# Altium footprint library NDLib.PCBLIB: 499 footprints (part 10 of 32)
Each footprint in its own frame and in the unit in brackets; x right, y up, seen from the top. Pads: shape width x height; smd on the part's side, far side on the other; paste and mask are expansions set on the pad; w line width, h text height; cw(c..) or ccw(c..) is an arc to the next point about the centre after c.
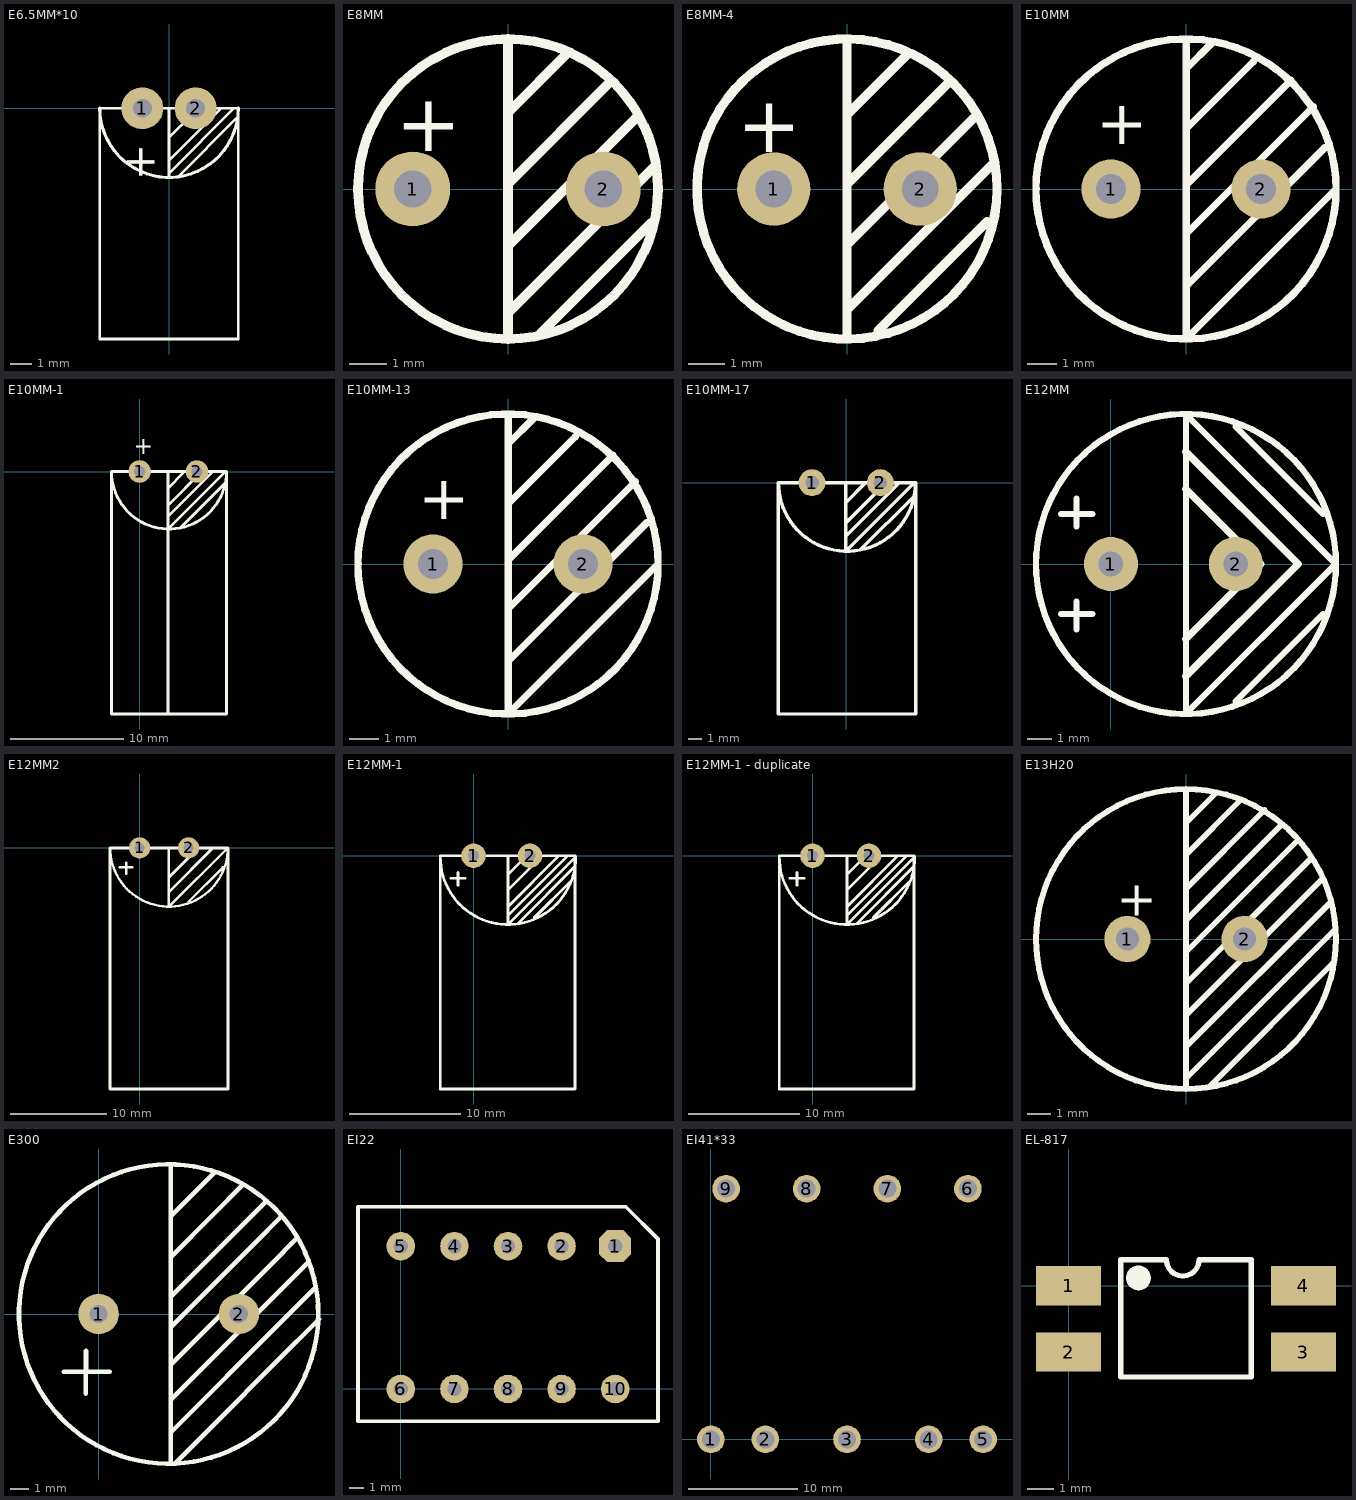
[diagram p9: the footprints below, top view; thin cyan lines are the x and y axes]

## E6.5MM*10 [mm]
pads (2):
  round 2 hole 0.9: 1(-1.27,0) 2(1.27,0)
TopOverlay:
  lines w0.127: 0,-3.3 0,0 -0.025,0 ; 0,-3.1 3.1,0 ; 0,-2.5 2.5,0 ; 0,-1.4 0.6,-0.8 ; 0.45,-3.25 3.2,-0.5 ; -0.025,0 3.3,0 3.3,-11 -3.3,-11 -3.3,0 -0.025,0
  lines w0.152: -3.3,0 ccw(c0,0) 3.3,0
  text "+" at -2,-1.7 h1.52

## E8MM [mm]
height 10
pads (2):
  round 2 hole 1: 1(-2.54,0) 2(2.54,0)
TopOverlay:
  circle w0.254: c0,0 r4
  lines w0.254: 0,-4 0,3.948 ; 0,-3.302 3.944,0.642 ; 0,-1.524 3.469,1.945 ; 0,-0.762 0,-0.508 ; 0,0.127 2.748,2.875 ; 0,0.254 0,0.508 ; 0,0.762 0,1.143 ; 0,2.032 1.617,3.649 ; 0,2.286 0,2.54 ; 0.854,-3.865 3.825,-0.894
  text "+" at -3,1 h1.52
3D body: height 7, standoff 0, extent -4.013,-4.039 2.838,3.987
3D body: height 7, standoff 0, extent 2.828,-2.863 4.013,2.812

## E8MM-4 [mm]
height 11
pads (2):
  round 2 hole 1: 1(-2,0) 2(2,0)
TopOverlay:
  circle w0.254: c0,0 r4.1
  lines w0.254: 0,-4 0,3.948 ; 0,-3.302 3.944,0.642 ; 0,-1.524 3.469,1.945 ; 0,-0.762 0,-0.508 ; 0,0.127 2.748,2.875 ; 0,0.254 0,0.508 ; 0,0.762 0,1.143 ; 0,2.032 1.617,3.649 ; 0,2.286 0,2.54 ; 0.854,-3.865 3.825,-0.894
  text "+" at -3,1 h1.52

## E10MM [mm]
pads (2):
  round 2 hole 1: 1(-2.54,0) 2(2.54,0)
TopOverlay:
  circle w0.254: c0,0 r5.08
  lines w0.254: 0,-3.302 4.699,1.397 ; 0,-1.524 4.318,2.794 ; 0,-0.762 0,-0.508 ; 0,0.127 3.556,3.683 ; 0,0.254 0,0.508 ; 0,0.762 0,1.143 ; 0,2.032 2.286,4.318 ; 0,2.286 0,2.54 ; 0,4.064 0.889,4.953 ; 0,5.08 0,-5.08 5.08,0
  text "+" at -3.048,1.524 h1.52

## E10MM-1 [mm]
pads (2):
  round 2 hole 1: 1(0,0) 2(5.08,0)
TopOverlay:
  lines w0.254: 2.5,-21.5 2.5,-5.1 ; 2.5,-4 6.5,0 ; 2.5,-3 5.5,0 7.6,0 2.5,-5.1 ; 2.5,-1.5 3.9,-0.1 ; 2.5,0 2.5,-5.1 ; 3.6,-5 7.6,-1 ; 7.66,0 -2.5,0 ; -2.5,0 ccw(c2.6,0) 7.7,0 7.7,-21.5 -2.5,-21.5 -2.5,0
  text "+" at -0.508,1.524 h1.52

## E10MM-13 [mm]
height 13
pads (2):
  round 2 hole 1: 1(-2.54,0) 2(2.54,0)
TopOverlay:
  circle w0.254: c0,0 r5.08
  lines w0.254: 0,-3.302 4.699,1.397 ; 0,-1.524 4.318,2.794 ; 0,-0.762 0,-0.508 ; 0,0.127 3.556,3.683 ; 0,0.254 0,0.508 ; 0,0.762 0,1.143 ; 0,2.032 2.286,4.318 ; 0,2.286 0,2.54 ; 0,4.064 0.889,4.953 ; 0,5.08 0,-5.08 5.08,0
  text "+" at -3.048,1.524 h1.52
3D body: height 13, standoff 0, extent -5.091,-5.091 3.6,5.091
3D body: height 13, standoff 0, extent 3.592,-3.6 5.091,3.6

## E10MM-17 [mm]
pads (2):
  round 2 hole 1: 1(-2.54,0) 2(2.54,0)
TopOverlay:
  lines w0.254: -0.04,-4 3.96,0 ; -0.04,-3 2.96,0 5.06,0 -0.04,-5.1 -0.04,0 ; -0.04,-1.5 1.36,-0.1 ; 1.06,-5 5.06,-1 ; 5.12,0 -5.04,0 ; -5.04,0 ccw(c0.06,0) 5.16,0 5.16,-17.2 -5.04,-17.2 -5.04,0

## E12MM [mm]
pads (2):
  round 2.2 hole 1: 1(0,0) 2(5.08,0)
TopOverlay:
  lines w0.254: -2.032,-2.032 -0.762,-2.032 ; -2.032,2.032 -0.762,2.032 ; -1.397,-2.667 -1.397,-1.524 ; -1.397,1.524 -1.397,2.667 ; 5.08,-5.588 8.636,-2.032 ; 5.08,5.588 8.636,2.032 ; -3.048,0 cw(c3.052,0) 9.152,0 cw(c3.052,0) -3.048,0 ; 3.048,-6.096 9.144,0 3.048,6.096 3.048,0 3.048,-6.096
  lines w0.3: 3.048,-4.572 7.62,0 3.048,4.572 ; 3.048,-3.048 6.096,0 3.048,3.048

## E12MM2 [mm]
pads (2):
  round 2.2 hole 1: 1(0,0) 2(5.08,0)
TopOverlay:
  lines w0.254: -3.048,0 ccw(c3.052,0) 9.152,0 ; -2.032,-2.032 -0.762,-2.032 ; -1.397,-2.667 -1.397,-1.524 ; 3.048,0 3.048,-6.096 9.144,0 ; 5.08,-5.588 8.636,-2.032
  lines w0.3: 3.048,-4.572 7.62,0 ; 3.048,-3.048 6.096,0 ; 9.144,0 -3.048,0 -3.048,-25 9.152,-25 9.152,-19.812 9.152,0

## E12MM-1 [mm]
pads (2):
  round 2.2 hole 1: 1(0,0) 2(5.08,0)
TopOverlay:
  lines w0.254: -3,-0.1 ccw(c3.1,-0.1) 9.2,-0.1 ; -2.032,-2.032 -0.762,-2.032 ; -1.397,-2.667 -1.397,-1.524 ; 3.1,-5.4 8.5,0 ; 3.1,-4.6 7.7,0 ; 3.1,-3.1 6.2,0 ; 3.1,-1.7 4.8,0 ; 3.1,0 3.1,-6.2 9.144,-0.156 ; 4,-6.1 9.1,-1 ; 5.461,-5.588 8.763,-2.286 ; -3,-21 -3,0 9.144,0 9.144,-21 -3,-21

## E12MM-1 - duplicate [mm]
pads (2):
  round 2.2 hole 1: 1(0,0) 2(5.08,0)
TopOverlay:
  lines w0.254: -3,-0.1 ccw(c3.1,-0.1) 9.2,-0.1 ; -2.032,-2.032 -0.762,-2.032 ; -1.397,-2.667 -1.397,-1.524 ; 3.1,-5.4 8.5,0 ; 3.1,-4.6 7.7,0 ; 3.1,-3.1 6.2,0 ; 3.1,-1.7 4.8,0 ; 3.1,0 3.1,-6.2 9.144,-0.156 ; 4,-6.1 9.1,-1 ; 5.461,-5.588 8.763,-2.286 ; -3,-21 -3,0 9.144,0 9.144,-21 -3,-21

## E13H20 [mm]
height 10
pads (2):
  round 2 hole 1: 1(-2.54,0) 2(2.54,0)
TopOverlay:
  circle w0.254: c0,0 r6.5
  lines w0.254: 0,-6.35 0,6.502 ; 0,-6.045 6.477,0.432 ; 0,-4.674 6.274,1.6 ; 0,-3.302 5.893,2.591 ; 0,-1.93 5.391,3.461 ; 0,-0.559 4.851,4.293 ; 0,0.813 4.089,4.902 ; 0,2.184 3.404,5.588 ; 0,3.658 2.388,6.045 ; 0,5.029 1.321,6.35 ; 1.016,-6.401 6.375,-1.041
  text "+" at -3,1 h1.52
3D body: height 20, standoff 0, extent 3.937,-5.204 6.398,5.204
3D body: height 20, standoff 0, extent -6.476,-6.511 3.936,6.511

## E300 [mm]
pads (2):
  round 2.2 hole 1: 1(0,0) 2(7.62,0)
TopOverlay:
  circle w0.254: c3.81,0 r8.128
  lines w0.254: -1.886,-3.136 0.614,-3.136 ; -0.698,-4.324 -0.698,-3.151 ; -0.682,-3.151 -0.682,-1.994 ; 3.917,-8.121 3.917,-6.435 ; 3.917,-4.657 9.886,1.312 11.386,2.812 ; 3.917,-2.752 9.378,2.709 10.771,4.102 ; 3.917,-0.72 8.489,3.852 9.904,5.267 ; 3.917,0.931 7.6,4.614 9.133,6.147 ; 3.917,3.09 6.203,5.376 7.861,7.034 ; 3.917,5.306 6.301,7.69 ; 3.917,8.114 3.917,5.757 3.917,-6.435 ; 4.137,-8.121 6.33,-5.927 9.632,-2.625 11.972,-0.285 ; 11.753,1.401 10.013,-0.339 3.917,-6.435

## EI22 [mil]
pads (10):
  oct 90x90 hole 40: 1(600,400)
  round 80 hole 40: 2(450,400) 3(300,400) 4(150,400) 5(0,400) 6(0,0) 7(150,0) 8(300,0) 9(450,0) 10(600,0)
TopOverlay:
  lines w10: -120,-90 -120,510 630,510 720,420 720,-90 -120,-90

## EI41*33 [mil]
pads (9):
  round 100 hole 65: 1(0,0) 2(196.85,0) 3(492.13,0) 4(787.4,0) 5(984.25,0) 6(929.13,905.51) 7(637.8,905.51) 8(346.46,905.51) 9(55.12,905.51)

## EL-817 [mm]
pads (4):
  rect 2.5x1.5 smd: 1(0,0) 2(0,-2.54) 3(9,-2.54) 4(9,0)
TopOverlay:
  circle w0.5: c2.676,0.3 r0.224
  lines w0.2: 3.7,1 2,1 2,-3.5 7,-3.5 7,1 5,1 cw(c4.375,1) 3.75,1
3D body: height 3.75, standoff -0.01, extent -0.52,-3.569 9.64,1.029